# Altium integrated library Connector.IntLib: 213 symbols (part 1 of 2) (continued)
## MOLEX 43045-0200
designator J?
Micro-Fit 3.0 Right-Angle Header, 3.00mm, Dual Row, 2 Circuits
footprint MOLEX 43045-0200 (Micro-Fit 3.0 Right Angle Header, 3.00mm Pitch, Dual Row, 2 Circuits)
pins: 1, 2

## MOLEX 43045-0212
designator J?
Micro-Fit 3.0 Vertical Header, 3.00mm Pitch, Dual Row, 2 Circuits
footprint MOLEX 43045-0212 (Micro-Fit 3.0 Vertical Header, 3.00mm Pitch, Dual Row, 2 Circuits)
pins: 1, 2

## MOLEX 43045-0400
designator J?
Micro-Fit 3.0 Right-Angle Header, 3.00mm Pitch, Dual Row, 4 Circuits
footprint MOLEX 43045-0400 (Micro-Fit 3.0 Right Angle Header, 3.00mm Pitch, Dual Row, 4 Circuits)
pins: 1, 2, 3, 4

## MOLEX 43045-0412
designator J?
Micro-Fit 3.0 Vertical Header, 3.00mm Pitch, Dual Row, 4 Circuits
footprint MOLEX 43045-0412 (Micro-Fit 3.0 Vertical Header, 3.00mm Pitch, Dual Row, 4 Circuits)
pins: 1, 2, 3, 4

## MOLEX 43045-0418
designator J?
Micro-Fit 3.0 Vertical Header, 3.00mm Pitch, Dual Row, 4 Circuits
footprint MOLEX 43045-0418 (Micro-Fit 3.0 Vertical Header, 3.00mm Pitch, Dual Row, 4 Circuits)
pins: 1, 2, 3, 4

## MOLEX 43045-0600
designator J?
Micro-Fit 3.0 Right-Angle Header, 3.00mm Pitch, Dual Row, 6 Circuits
footprint MOLEX 43045-0600 (Micro-Fit 3.06 Right Angle Header, 3.00mm Pitch, Dual Row, 6 Circuits)
pins: 1, 2, 3, 4, 5, 6

## MOLEX 43045-0612
designator J?
Micro-Fit 3.0 Vertical Header, 3.00mm Pitch, Dual Row, 6 Circuits
footprint MOLEX 43045-0612 (Micro-Fit 3.0 Vertical Header, 3.00mm Pitch, Dual Row, 6 Circuits)
pins: 1, 2, 3, 4, 5, 6

## MOLEX 43045-0618
designator J?
Micro-Fit 3.0 Vertical Header, 3.00mm Pitch, Dual Row, 6 Circuits
footprint MOLEX 43045-0618 (Micro-Fit 3.0 Vertical Header, 3.00mm Pitch, Dual Row, 6 Circuits)
pins: 1, 2, 3, 4, 5, 6

## MOLEX 43045-0800
designator J?
Micro-Fit 3.0 Right-Angle Header, 3.00mm Pitch, Dual Row, 8 Circuits
footprint MOLEX 43045-0800 (Micro-Fit 3.0 Right Angle Header, 3.00mm Pitch, Dual Row, 8 Circuits)
pins: 1, 2, 3, 4, 5, 6, 7, 8

## MOLEX 43045-0812
designator J?
Micro-Fit 3.0 Vertical Header, 3.00mm Pitch, Dual Row, 8 Circuits
footprint MOLEX 43045-0812 (Micro-Fit 3.0 Vertical Header, 3.00mm Pitch, Dual Row, 8 Circuits)
pins: 1, 2, 3, 4, 5, 6, 7, 8

## MOLEX 43045-1000
designator J?
Micro-Fit 3.0 Right-Angle Header, 3.00mm Pitch, Dual Row, 10 Circuits
footprint MOLEX 43045-1000 (Micro-Fit 3.0 Right Angle Header, 3.00mm Pitch, Dual Row, 10 Circuits)
pins: 1, 2, 3, 4, 5, 6, 7, 8, 9, 10

## MOLEX 43045-1012
designator J?
Micro-Fit 3.0 Vertical Header, 3.00mm Pitch, Dual Row, 10 Circuits
footprint MOLEX 43045-1012 (Micro-Fit 3.0 Vertical Header, 3.00mm Pitch, Dual Row, 10 Circuits)
pins: 1, 2, 3, 4, 5, 6, 7, 8, 9, 10

## MOLEX 43045-1200
designator J?
Micro-Fit 3.0 Right-Angle Header, 3.00mm Pitch, Dual Row, 12 Circuits
footprint MOLEX 43045-1200 (Micro-Fit 3.0 Right Angle Header, 3.00mm Pitch, Dual Row, 12 Circuits)
pins: 1, 2, 3, 4, 5, 6, 7, 8, 9, 10, 11, 12

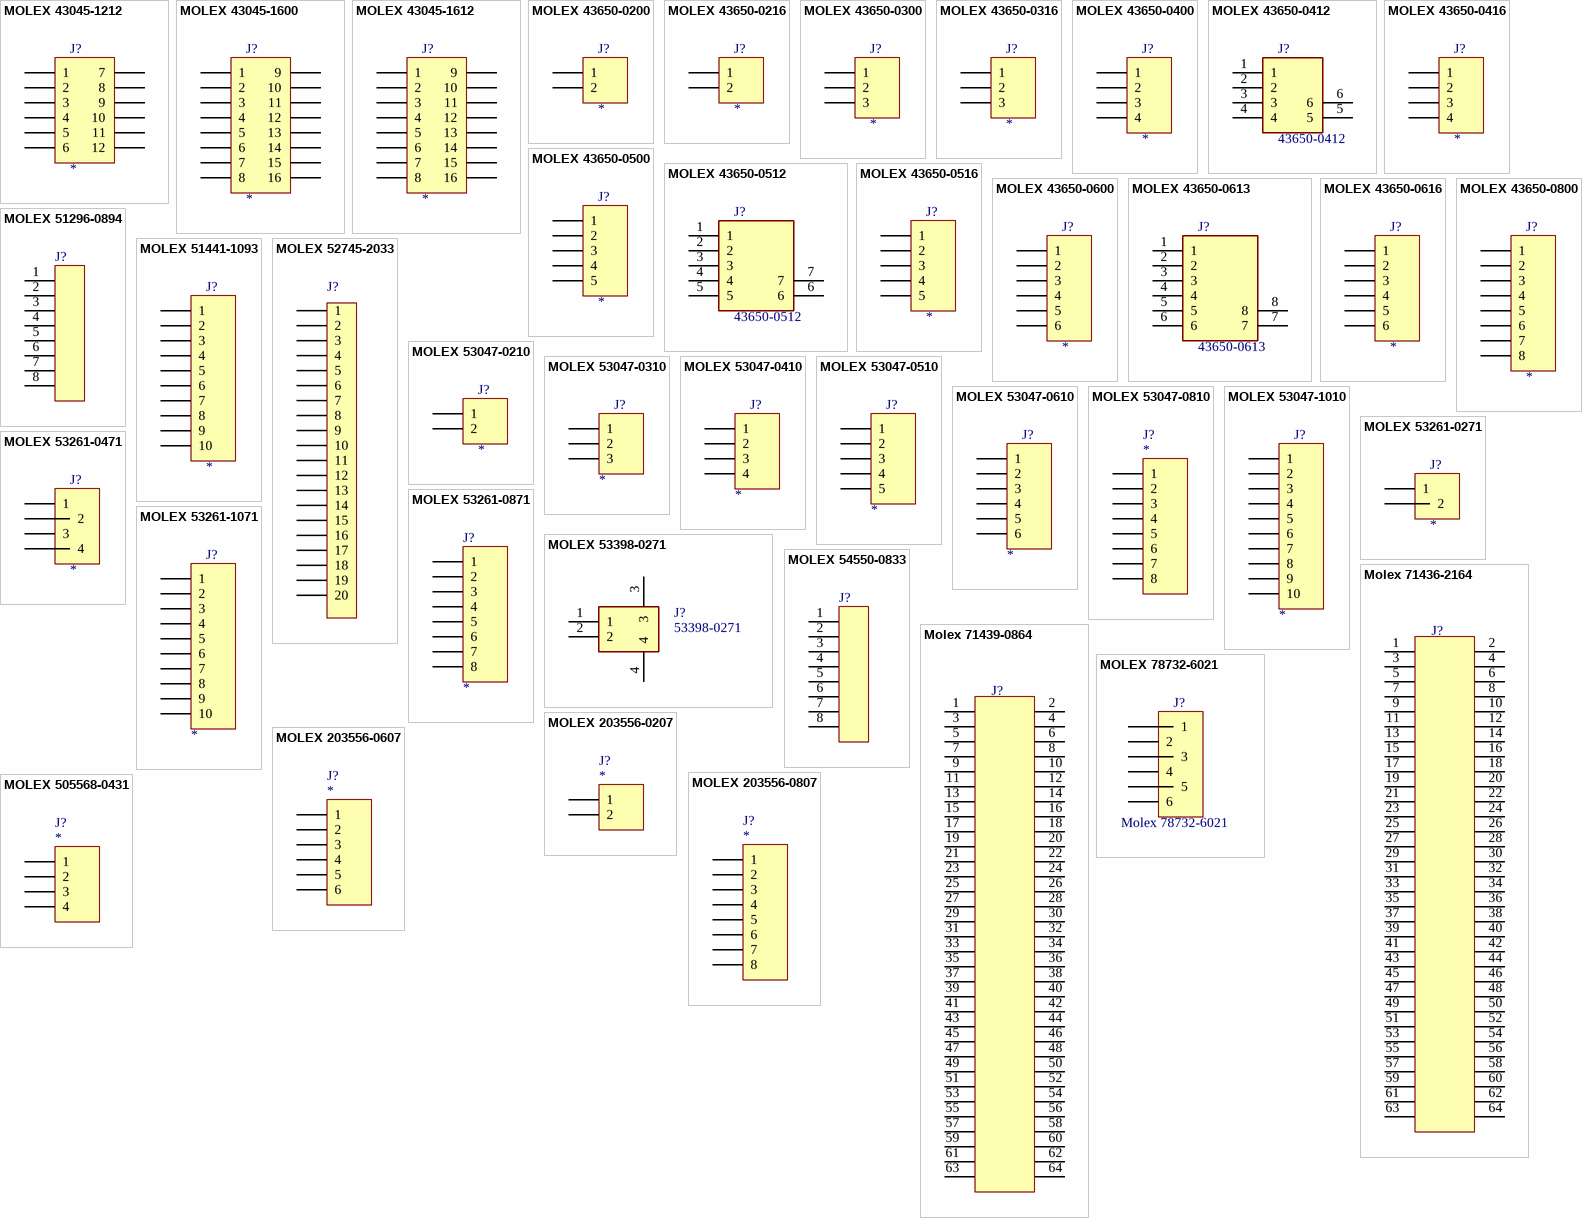
[diagram p4: symbols MOLEX 43045-1212 to MOLEX 505568-0431]

## MOLEX 43045-1212
designator J?
Micro-Fit 3.0 Vertical Header, 3.00mm Pitch, Dual Row, 12 Circuits
footprint MOLEX 43045-1212 (Micro-Fit 3.0 Vertical Header, 3.00mm Pitch, Dual Row, 12 Circuits)
pins: 1, 2, 3, 4, 5, 6, 7, 8, 9, 10, 11, 12

## MOLEX 43045-1600
designator J?
Micro-Fit 3.0 Right-Angle Header, 3.00mm Pitch, Dual Row, 16 Circuits
footprint MOLEX 43045-1600 (Micro-Fit 3.0 Right Angle Header, 3.00mm Pitch, Dual Row, 16 Circuits)
pins: 1, 2, 3, 4, 5, 6, 7, 8, 9, 10, 11, 12, 13, 14, 15, 16

## MOLEX 43045-1612
designator J?
Micro-Fit 3.0 Vertical Header, 3.00mm Pitch, Dual Row, 16 Circuits
footprint MOLEX 43045-1612 (Micro-Fit 3.0 Vertical Header, 3.00mm Pitch, Dual Row, 16 Circuits)
pins: 1, 2, 3, 4, 5, 6, 7, 8, 9, 10, 11, 12, 13, 14, 15, 16

## MOLEX 43650-0200
designator J?
Micro-Fit 3.0 Right-Angle Header, 3.00mm Pitch, Single Row, 2 Circuits
footprint MOLEX 43650-0200 (Micro-Fit 3.0 Right Angle Header, 3.00mm Pitch, Single Row, 2 Circuits)
pins: 1, 2

## MOLEX 43650-0216
designator J?
Micro-Fit 3.0 Vertical Header, 3.00mm Pitch, Single Row, 2 Circuits
footprint MOLEX 43650-0216 (Micro-Fit 3.0 Vertical Header, 3.00mm Pitch, Single Row, 2 Circuits)
pins: 1, 2

## MOLEX 43650-0300
designator J?
Micro-Fit 3.0 Right-Angle Header, 3.00mm Pitch, Single Row, 3 Circuits
footprint MOLEX 43650-0300 (Micro-Fit 3.0 Right Angle Header, 3.00mm Pitch, Single Row, 3 Circuits)
pins: 1, 2, 3

## MOLEX 43650-0316
designator J?
Micro-Fit 3.0 Vertical Header, 3.00mm Pitch, Single Row, 3 Circuits
footprint MOLEX 43650-0316 (Micro-Fit 3.0 Vertical Header, 3.00mm Pitch, Single Row, 3 Circuits)
pins: 1, 2, 3

## MOLEX 43650-0400
designator J?
Micro-Fit 3.0 Right-Angle Header, 3.00mm Pitch, Single Row, 4 Circuits
footprint MOLEX 43650-0400 (Micro-Fit 3.0 Right Angle Header, 3.00mm Pitch, Single Row, 4 Circuits)
pins: 1, 2, 3, 4

## MOLEX 43650-0412
designator J?, comment 43650-0412
MicroFit RA HDR 4Ckt SR SMT w/SldTab; Manufacturer: Molex; Mouser No: 538-43650-0412; Value: 43650-0412
footprint MOLEX 43650-0412 (MicroFit RA HDR 4Ckt SR SMT w/SldTab)
pins: 1, 2, 3, 4, 5, 6

## MOLEX 43650-0416
designator J?
Micro-Fit 3.0 Vertical Header, 3.00mm Pitch, Single Row, 4 Circuits
footprint MOLEX 43650-0416 (Micro-Fit 3.0 Vertical Header, 3.00mm Pitch, Single Row, 4 Circuits)
pins: 1, 2, 3, 4

## MOLEX 43650-0500
designator J?
Micro-Fit 3.0 Right-Angle Header, 3.00mm Pitch, Single Row, 5 Circuits
footprint MOLEX 43650-0500 (Micro-Fit 3.0 Right Angle Header, 3.00mm Pitch, Single Row, 5 Circuits)
pins: 1, 2, 3, 4, 5

## MOLEX 43650-0512
designator J?, comment 43650-0512
MicroFit RA HDR 5Ckt SR SMT w/SldTab; Manufacturer: Molex; Mouser No: 538-43650-0512; Value: 43650-0512
footprint MOLEX 43650-0512 (MicroFit RA HDR 5Ckt SR SMT w/SldTab)
pins: 1, 2, 3, 4, 5, 6, 7

## MOLEX 43650-0516
designator J?
Micro-Fit 3.0 Vertical Header, 3.00mm Pitch, Single Row, 5 Circuits
footprint MOLEX 43650-0516 (Micro-Fit 3.0 Vertical Header, 3.00mm Pitch, Single Row, 5 Circuits)
pins: 1, 2, 3, 4, 5

## MOLEX 43650-0600
designator J?
Micro-Fit 3.0 Right-Angle Header, 3.00mm Pitch, Single Row, 6 Circuits
footprint MOLEX 43650-0600 (Micro-Fit 3.0 Right Angle Header, 3.00mm Pitch, Single Row, 6 Circuits)
pins: 1, 2, 3, 4, 5, 6

## MOLEX 43650-0613
designator J?, comment 43650-0613
Micro-Fit 3.0 Right-Angle Header, 3.00mm Pitch, Single Row, 6 Circuits, with SolderTab, Gold, Glow-Wire Capable, Black; Manufacturer: Molex; Mouser No: 538-43650-0613; Value: 43650-0613
footprint MOLEX 43650-0613 (Micro-Fit 3.0 Right-Angle Header, 3.00mm Pitch, Single Row, 6 Circuits, with SolderTab, Gold, Glow-Wire Capable, Black)
pins: 1, 2, 3, 4, 5, 6, 7, 8

## MOLEX 43650-0616
designator J?
Micro-Fit 3.0 Vertical Header, 3.00mm Pitch, Single Row, 6 Circuits
footprint MOLEX 43650-0616 (Micro-Fit 3.0 Vertical Header, 3.00mm Pitch, Single Row, 6 Circuits)
pins: 1, 2, 3, 4, 5, 6

## MOLEX 43650-0800
designator J?
Micro-Fit 3.0 Right-Angle Header, 3.00mm Pitch, Single Row, 8 Circuits
footprint MOLEX 43650-0800 (Micro-Fit 3.0 Right Angle Header, 3.00mm Pitch, Single Row, 8 Circuits)
pins: 1, 2, 3, 4, 5, 6, 7, 8

## MOLEX 51296-0894
designator J?  (value not drawn)
FFC/FPC Connector 8 pins, 1.30mm Height, Right-Angle; Value: MOLEX 51296-0894
footprint MOLEX 51296-0894 (FPC Connector, 8-Leads, Right Angle, Pitch 0.5 mm, Mated Height 1.3 mm, SMT)
pins: 1, 2, 3, 4, 5, 6, 7, 8

## MOLEX 51441-1093
designator J?
0.50mm Pitch, FFC/FPC Connector, Right Angle, SMT, ZIF, Bottom / Contact Style, 10 Circuits
footprint MOLEX 51441-1093 (USB-MICRO-B HIROSE nr. ZX62D-B-5PA8)
pins: 1, 2, 3, 4, 5, 6, 7, 8, 9, 10

## MOLEX 52745-2033
designator J?, comment MOLEX 51296-0894  (value not drawn)
0.50mm Pitch,  FFC/FPC Connector, Right Angle, Surface Mount, ZIF, Top / Contact Style, 20 Circuits; Value: MOLEX 51296-0894
footprint MOLEX 52745-2033 (0.50mm Pitch Easy-On FFC/FPC Connector, Right Angle, Surface Mount, ZIF, Top Contact Style,  20 Circuits)
pins: 1, 2, 3, 4, 5, 6, 7, 8, 9, 10, 11, 12, 13, 14, 15, 16, 17, 18, 19, 20

## MOLEX 53047-0210
designator J?
1.25mm Pitch PicoBlade Vertical, 2 Circuits
footprint MOLEX 530470210 (1.25mm Pitch, PicoBlade PCB Header, Single Row, Vertical, Through Hole, 2 Circuits)
pins: 1, 2

## MOLEX 53047-0310
designator J?
1.25mm Pitch PicoBlade Vertical, 3 Circuits
footprint MOLEX 530470310 (1.25mm Pitch, PicoBlade PCB Header, Single Row, Vertical, Through Hole, 3 Circuits)
pins: 1, 2, 3

## MOLEX 53047-0410
designator J?
1.25mm Pitch PicoBlade Vertical, 4 Circuits
footprint MOLEX 530470410 (1.25mm Pitch, PicoBlade PCB Header, Single Row, Vertical, Through Hole, 4 Circuits)
pins: 1, 2, 3, 4

## MOLEX 53047-0510
designator J?
1.25mm Pitch PicoBlade Vertical, 5 Circuits
footprint MOLEX 530470510 (1.25mm Pitch, PicoBlade PCB Header, Single Row, Vertical, Through Hole, 5 Circuits)
pins: 1, 2, 3, 4, 5

## MOLEX 53047-0610
designator J?
1.25mm Pitch PicoBlade Vertical, 6 Circuits
footprint MOLEX 530470610 (1.25mm Pitch, PicoBlade PCB Header, Single Row, Vertical, Through Hole, 6 Circuits)
pins: 1, 2, 3, 4, 5, 6

## MOLEX 53047-0810
designator J?
1.25mm Pitch PicoBlade Vertical, 8 Circuits
footprint MOLEX 530470810 (1.25mm Pitch, PicoBlade PCB Header, Single Row, Vertical, Through Hole, 8 Circuits)
pins: 1, 2, 3, 4, 5, 6, 7, 8

## MOLEX 53047-1010
designator J?
1.25mm Pitch PicoBlade Vertical, 10 Circuits
footprint MOLEX 530471010 (1.25mm Pitch, PicoBlade PCB Header, Single Row, Vertical, Through Hole, 10 Circuits)
pins: 1, 2, 3, 4, 5, 6, 7, 8, 9, 10

## MOLEX 53261-0271
designator J?
1.25mm Pitch PicoBlade Header, Surface Mount, Right Angle, 2 Circuits; Value: *
footprint MOLEX 53261-0271 (1.25mm Pitch PicoBlade Header, Surface Mount, Right Angle, 2 Circuits)
pins: 1, 2

## MOLEX 53261-0471
designator J?
1.25mm Pitch PicoBlade Header, Surface Mount, Right Angle, 4 Circuits; Value: *
footprint MOLEX 53261-0471 (1.25mm Pitch PicoBlade Header, Surface Mount, Right Angle, 4 Circuits)
pins: 1, 2, 3, 4

## MOLEX 53261-0871
designator J?
1.25mm Pitch PicoBlade Header, Surface Mount, Right Angle, 8 Circuits; Value: *
footprint MOLEX 53261-0871 (1.25mm Pitch PicoBlade Header, Surface Mount, Right Angle, 8 Circuits)
pins: 1, 2, 3, 4, 5, 6, 7, 8

## MOLEX 53261-1071
designator J?
1.25mm Pitch PicoBlade Header, Surface Mount, Right Angle, 10 Circuits; Value: *
footprint MOLEX 53261-1071 (1.25mm Pitch PicoBlade Header, Surface Mount, Right Angle, 10 Circuits)
pins: 1, 2, 3, 4, 5, 6, 7, 8, 9, 10

## MOLEX 53398-0271
designator J?, comment 53398-0271
Sockel & Kabelgehäuse VERTICAL HDR SMT 2P; Manufacturer: Molex; Value: 53398-0271; Mouser No: 538-53398-0271
footprint MOLEX 53398-0271 (Sockel & Kabelgehäuse VERTICAL HDR SMT 2P)
pins: 1, 2, 3, 4

## MOLEX 54550-0833
designator J?  (value not drawn)
0.50mm Pitch Easy-On Type FFC/FPC Connector, 1.20mm Height, Right Angle, Surface Mount, ZIF, Top Contact Style, 8 Circuits; Value: MOLEX 54550-0833
footprint MOLEX 54550-0833 (0.50mm Pitch Easy-On Type FFC/FPC Connector, 1.20mm Height, Right Angle, Surface Mount, ZIF, Top Contact Style, 8 Circuits)
pins: 1, 2, 3, 4, 5, 6, 7, 8

## Molex 71436-2164
designator J?  (value not drawn)
Board-to-Board Plug, Vertical, 2-Row, Pitch 1.00mm, 64-Position; Value: *
footprint Molex 71436-2164 (Board-to-Board Plug, Vertical, 2-Row, Pitch 1.0mm, 64-Position)
pins: 1, 2, 3, 4, 5, 6, 7, 8, 9, 10, 11, 12, 13, 14, 15, 16, 17, 18, 19, 20, 21, 22, 23, 24, 25, 26, 27, 28, 29, 30, 31, 32, 33, 34, 35, 36, 37, 38, 39, 40, 41, 42, 43, 44, 45, 46, 47, 48, 49, 50, 51, 52, 53, 54, 55, 56, 57, 58, 59, 60, 61, 62, 63, 64

## Molex 71439-0864
designator J?  (value not drawn)
Board-to-Board Receptacle, Vertical, 2-Row, Pitch 1.00mm, 64-Position; Value: *
footprint Molex 71439-0864 (Board-to-Board Connector, Vertical, 2-Row, Pitch 1.0mm, 64-Position)
pins: 1, 2, 3, 4, 5, 6, 7, 8, 9, 10, 11, 12, 13, 14, 15, 16, 17, 18, 19, 20, 21, 22, 23, 24, 25, 26, 27, 28, 29, 30, 31, 32, 33, 34, 35, 36, 37, 38, 39, 40, 41, 42, 43, 44, 45, 46, 47, 48, 49, 50, 51, 52, 53, 54, 55, 56, 57, 58, 59, 60, 61, 62, 63, 64

## MOLEX 78732-6021
designator J?  value Molex 78732-6021
Compression Connector, Staggered contacts, 1.63mm Working Height, 6 Circuits
footprint MOLEX 78732-6021 (Compression Connector, Staggered contacts, 1.63mm Working Height, 6 Circuits)
pins: 1, 2, 3, 4, 5, 6

## MOLEX 203556-0207
designator J?
1.00mm Pitch, Pico-Clasp PCB Header, Single Row, Vertical, 2 Circuits
footprint MOLEX 203556-0207 (Connector 1.00mm Pitch, Molex Pico-Clasp PCB Header, Single Row, Vertical, Surface Mount, Friction Lock, 2 Circuits)
pins: 1, 2

## MOLEX 203556-0607
designator J?
1.00mm Pitch, Pico-Clasp PCB Header, Single Row, Vertical, 6 Circuits
footprint MOLEX 203556-0607 (Connector 1.00mm Pitch, Molex Pico-Clasp PCB Header, Single Row, Vertical, Surface Mount, with Inner Positive Lock, 6 Circuits)
pins: 1, 2, 3, 4, 5, 6

## MOLEX 203556-0807
designator J?
1.00mm Pitch, Pico-Clasp PCB Header, Single Row, Vertical, 8 Circuits
footprint MOLEX 203556-0807 (Connector 1.00mm Pitch, Molex Pico-Clasp PCB Header, Single Row, Vertical, Surface Mount, with Inner Positive Lock, 8 Circuits)
pins: 1, 2, 3, 4, 5, 6, 7, 8

## MOLEX 505568-0431
designator J?
1.25mm Pitch, Micro-Lock Plus PCB Header, Single Row, Vertical, Surface Mount, 4 Circuits
footprint MOLEX 505568-0431 (Connector 1.25mm Pitch, Molex Micro-Lock Plus PCB Header, Single Row, Vertical, Surface Mount,, Positive Lock, 4 Circuits,)
pins: 1, 2, 3, 4

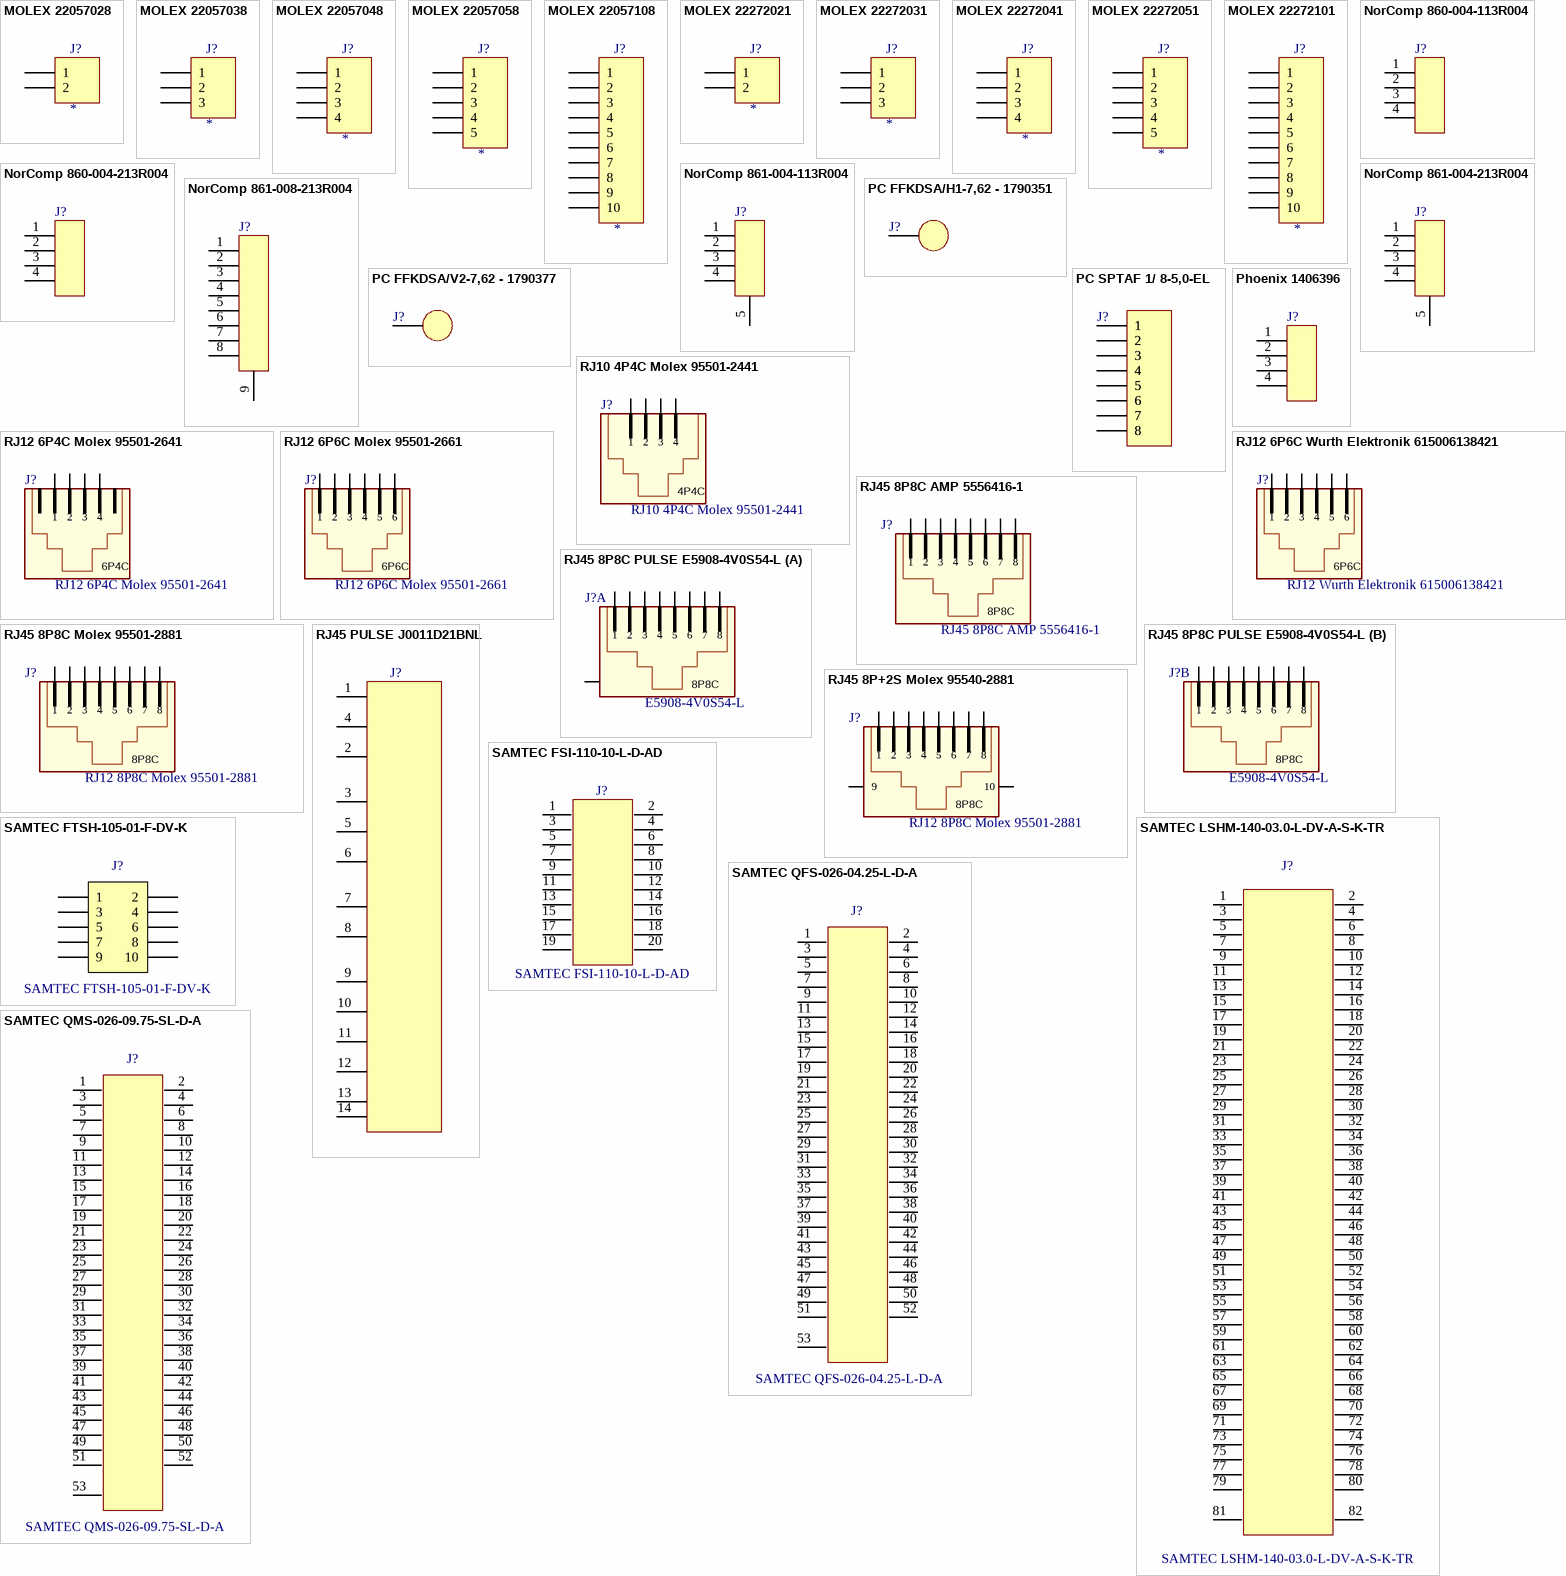
[diagram p5: symbols MOLEX 22057028 to SAMTEC QMS-026-09.75-SL-D-A]

## MOLEX 22057028
designator J?
KK 254 Wire-to-Board Header, Right-Angle, 2 Circuits
footprint MOLEX 22057028 (KK 254 Wire-to-Board Header, Right-Angle, 2 Circuits)
pins: 1, 2

## MOLEX 22057038
designator J?
KK 254 Wire-to-Board Header, Right-Angle, 3 Circuits
footprint MOLEX 22057038 (KK 254 Wire-to-Board Header, Right-Angle, 3 Circuits)
pins: 1, 2, 3

## MOLEX 22057048
designator J?
KK 254 Wire-to-Board Header, Right-Angle, 4 Circuits
footprint MOLEX 22057048 (KK 254 Wire-to-Board Header, Right-Angle, 4 Circuits)
pins: 1, 2, 3, 4

## MOLEX 22057058
designator J?
KK 254 Wire-to-Board Header, Right-Angle, 5 Circuits
footprint MOLEX 22057058 (KK 254 Wire-to-Board Header, Right-Angle, 5 Circuits)
pins: 1, 2, 3, 4, 5

## MOLEX 22057108
designator J?
KK 254 Wire-to-Board Header, Right-Angle, 10 Circuits
footprint MOLEX 22057108 (KK 254 Wire-to-Board Header, Right-Angle, 10 Circuits)
pins: 1, 2, 3, 4, 5, 6, 7, 8, 9, 10

## MOLEX 22272021
designator J?
KK 254 Wire-to-Board Header, Vertical, 2 Circuits
footprint MOLEX 22272021 (KK 254 Wire-to-Board Header, Vertical, 2 Circuits)
pins: 1, 2

## MOLEX 22272031
designator J?
KK 254 Wire-to-Board Header, Vertical, 3 Circuits
footprint MOLEX 22272031 (KK 254 Wire-to-Board Header, Vertical, 3 Circuits)
pins: 1, 2, 3

## MOLEX 22272041
designator J?
KK 254 Wire-to-Board Header, Vertical, 4 Circuits
footprint MOLEX 22272041 (KK 254 Wire-to-Board Header, Vertical, 4 Circuits)
pins: 1, 2, 3, 4

## MOLEX 22272051
designator J?
KK 254 Wire-to-Board Header, Vertical, 5 Circuits
footprint MOLEX 22272051 (KK 254 Wire-to-Board Header, Vertical, 5 Circuits)
pins: 1, 2, 3, 4, 5

## MOLEX 22272101
designator J?
KK 254 Wire-to-Board Header, Vertical, 10 Circuits
footprint MOLEX 22272101 (KK 254 Wire-to-Board Header, Vertical, 10 Circuits)
pins: 1, 2, 3, 4, 5, 6, 7, 8, 9, 10

## NorComp 860-004-113R004
designator J?  (value not drawn)
Circular Male Metric Connectors M12 4 Pos; Value: NorComp 860-004-113R004
footprint NorComp 860-004-113R004 (Connector NorComp 860-004-113R004)
pins: 1, 2, 3, 4

## NorComp 860-004-213R004
designator J?  (value not drawn)
Circular Female Metric Connectors M12 4 Pos; value: NorComp 860-004-213R004
footprint NorComp 860-004-213R004 (Connector NorComp 860-004-213R004)
pins: 1, 2, 3, 4

## NorComp 861-004-113R004
designator J?  (value not drawn)
Circular Male Metric Connectors M12 4 Pos; Value: NorComp 861-004-113R004
footprint NorComp 861-004-113R004 (Connector NorComp 861-004-113R004)
pins: 1, 2, 3, 4, 5

## NorComp 861-004-213R004
designator J?  (value not drawn)
Circular Female Metric Connectors M12 4 Pos; value: NorComp 861-004-213R004
footprint NorComp 861-004-213R004 (Connector NorComp 861-004-213R004)
pins: 1, 2, 3, 4, 5

## NorComp 861-008-213R004
designator J?  (value not drawn)
Circular Female Metric Connectors M12 8 Pos; value: NorComp 861-008-213R004
footprint NorComp 861-008-213R004
pins: 1, 2, 3, 4, 5, 6, 7, 8, 9

## PC FFKDSA/H1-7,62 - 1790351
designator J?  (value not drawn)
Phoenix Contact PCB terminal block - FFKDSA/H1-7,62 - 1790351; Value: *
footprint PC FFKDSA/H1-7,62 - 1790351 (Phoenix Contact PCB terminal block - FFKDSA/H1-7,62 - 1790351)
pins: 1 TB, 2 TB

## PC FFKDSA/V2-7,62 - 1790377
designator J?  (value not drawn)
Phoenix Contact PCB terminal block - FFKDSA/V2-7,62 - 1790377; Value: *
footprint PC FFKDSA/V2-7,62 - 1790377 (Phoenix Contact PCB terminal block - FFKDSA/H1-7,62 - 1790351)
pins: 1 TB, 2 TB

## PC SPTAF 1/ 8-5,0-EL
designator J?  (value not drawn)
Phoenix Contact PCB terminal block - SPTAF 1/ 8-5,0-EL  - 1862411; Value: *
footprint PC SPTAF 1/ 8-5,0-EL (Phoenix Contact PCB terminal block - SPTAF 1/ 8-5,0-EL  - 1862411)
pins: 1, 1' 1, 2, 2' 2, 3, 3' 3, 4, 4' 4, 5, 5' 5, 6, 6' 6, 7, 7' 7, 8, 8' 8

## Phoenix 1406396
designator J?  (value not drawn)
4 Position Circular Connector Insert, Male Pins; value: Phoenix 1406396
footprint Phoenix 1406396 (Connector Phoenix 1406396)
pins: 1, 2, 3, 4

## RJ10 4P4C Molex 95501-2441
designator J?
Modular Jack Horizontal Plastic 4P4C; Value: RJ10 4P4C Molex 95501-2441
footprint RJ10 4P4C Molex 95501-2441 (Modular Jack, Right Angle, Through Hole , 4/4,Low Profile)
pins: 1, 2, 3, 4
text: 4P4C

## RJ12 6P4C Molex 95501-2641
designator J?
Modular Jack Horizontal Plastic 6P4C; Value: RJ12 6P4C Molex 95501-2641
footprint RJ12 6P4C Molex 95501-2641 (Modular Jack, Right Angle, Through Hole , 6/4,Low Profile)
pins: 1, 2, 3, 4
text: 6P4C

## RJ12 6P6C Molex 95501-2661
designator J?
Modular Jack Horizontal Plastic 6P6C; Value: RJ12 6P6C Molex 95501-2661
footprint RJ12 6P6C Molex 95501-2661 (Modular Jack, Right Angle, Through Hole , 6/6,Low Profile)
pins: 1, 2, 3, 4, 5, 6
text: 6P6C

## RJ12 6P6C Wurth Elektronik 615006138421
designator J?, comment RJ12 Wurth Elektronik 615006138421
Modular Jack Horizontal Plastic 6P6C; Value: RJ12 Wurth Elektronik 615006138421
footprint RJ12 Wurth Elektronik 615006138421 (Footprint not found)
pins: 1, 2, 3, 4, 5, 6
text: 6P6C

## RJ45 8P8C AMP 5556416-1
designator J?
Modular Jack Vertical Plastic 8P8C; Value: RJ45 8P8C AMP 5556416-1
footprint RJ45 8P8C AMP 5556416-1 (Modular Jack, Straight, Through Hole , 8/8)
pins: 1, 2, 3, 4, 5, 6, 7, 8
text: 8P8C

## RJ45 8P8C Molex 95501-2881
designator J?, comment RJ12 8P8C Molex 95501-2881
Modular Jack Horizontal Plastic 8P8C; Value: RJ12 8P8C Molex 95501-2881
footprint RJ45 8P8C Molex 95501-2881 (Modular Jack, Right Angle, Through Hole , 8/8,Low Profile)
pins: 1, 2, 3, 4, 5, 6, 7, 8
text: 8P8C

## RJ45 8P8C PULSE E5908-4V0S54-L
designator J?, comment E5908-4V0S54-L
RJ45 2X1 8P8C Ethernet Connectors CONN 30u Au THT; Manufacturer: Pulse Electronics; Value: E5908-4V0S54-L; Mouser No.: 673-E5908-4V0S54-L
footprint RJ45 8P8C PULSE E5908-4V0S54-L (RJ45 2X1 8P8C Ethernet Connectors CONN 30u Au THT)
part A pins: 1A, 2A, 3A, 4A, 5A, 6A, 7A, 8A, 9, 10, 11, 12 SHIELD
part B pins: 1B, 2B, 3B, 4B, 5B, 6B, 7B, 8B
part A text: 1; 2; 3; 4; 5; 6; 7; 8; 8P8C
part B text: 1; 2; 3; 4; 5; 6; 7; 8; 8P8C

## RJ45 8P+2S Molex 95540-2881
designator J?, comment RJ12 8P8C Molex 95501-2881
Modular Jack Horizontal Plastic 10P10C; Value: RJ12 8P8C Molex 95501-2881
footprint RJ45 8P+2S Molex 95540-2881 (Modular Jack, Right Angle, Through Hole , 8/8,Low Profile)
pins: 1, 2, 3, 4, 5, 6, 7, 8, 9, 10
text: 8P8C

## RJ45 PULSE J0011D21BNL
designator J?, comment RJ45-PULSE-J0011D21BNL  (value not drawn)
Integrated connector modules 10/100 base-TX belMag with LEDs
footprint RJ45 PULSE J0011D21BNL (100 Base-TX (Fast Ethernet) RJ45 1x1 Tab-DOWN with LEDs 8-pin)
pins: 1 TD+, 2 TD-, 3 RD+, 4 CT, 5 CT, 6 RD-, 7 NC, 8 CHS_GND, 9 LEDL_A, 10 LEDL_K, 11 LEDR_K, 12 LEDR_A, 13 SHIELD, 14 SHIELD

## SAMTEC FSI-110-10-L-D-AD
designator J?
LOW PROFILE & ELEVATED ONE-PIECE; Value: SAMTEC FSI-110-10-L-D-AD
footprint SAMTEC FSI-110-10-L-D-AD (LOW PROFILE & ELEVATED ONE-PIECE)
pins: 1, 2, 3, 4, 5, 6, 7, 8, 9, 10, 11, 12, 13, 14, 15, 16, 17, 18, 19, 20

## SAMTEC FTSH-105-01-F-DV-K
designator J?
SAMTEC SMD MICRO HEADER 2x5; Value: SAMTEC FTSH-105-01-F-DV-K
footprint SAMTEC FTSH-105-01-F-DV-K (SAMTEC SMD MICRO HEADER 2x5)
pins: 1, 2, 3, 4, 5, 6, 7, 8, 9, 10

## SAMTEC LSHM-140-03.0-L-DV-A-S-K-TR
designator J?
0.50MM TERMINAL/SOCKET COMBO,80 PINS.; Value: *
footprint SAMTEC LSHM-140-03.0-L-DV-A-S-K-TR (0.50 mm Razor Beam™ High-Speed Hermaphroditic Terminal/Socket Strip)
pins: 1, 2, 3, 4, 5, 6, 7, 8, 9, 10, 11, 12, 13, 14, 15, 16, 17, 18, 19, 20, 21, 22, 23, 24, 25, 26, 27, 28, 29, 30, 31, 32, 33, 34, 35, 36, 37, 38, 39, 40, 41, 42, 43, 44, 45, 46, 47, 48, 49, 50, 51, 52, 53, 54, 55, 56, 57, 58, 59, 60, 61, 62, 63, 64, 65, 66, 67, 68, 69, 70, 71, 72, 73, 74, 75, 76, 77, 78, 79, 80, 81 Shield, 82 Shield

## SAMTEC QFS-026-04.25-L-D-A
designator J?
RUGGED GROUND PLANE SOCKET; Value: SAMTEC QFS-026-04.25-L-D-A
footprint SAMTEC QFS-026-04.25-L-D-A (RUGGED GROUND PLANE SOCKET)
pins: 1, 2, 3, 4, 5, 6, 7, 8, 9, 10, 11, 12, 13, 14, 15, 16, 17, 18, 19, 20, 21, 22, 23, 24, 25, 26, 27, 28, 29, 30, 31, 32, 33, 34, 35, 36, 37, 38, 39, 40, 41, 42, 43, 44, 45, 46, 47, 48, 49, 50, 51, 52, 53 Shield

## SAMTEC QMS-026-09.75-SL-D-A
designator J?
RUGGED GROUND PLANE HEADER; Value: SAMTEC QMS-026-09.75-SL-D-A
footprint SAMTEC QMS-026-09.75-SL-D-A (RUGGED GROUND PLANE HEADER)
pins: 1, 2, 3, 4, 5, 6, 7, 8, 9, 10, 11, 12, 13, 14, 15, 16, 17, 18, 19, 20, 21, 22, 23, 24, 25, 26, 27, 28, 29, 30, 31, 32, 33, 34, 35, 36, 37, 38, 39, 40, 41, 42, 43, 44, 45, 46, 47, 48, 49, 50, 51, 52, 53 Shield

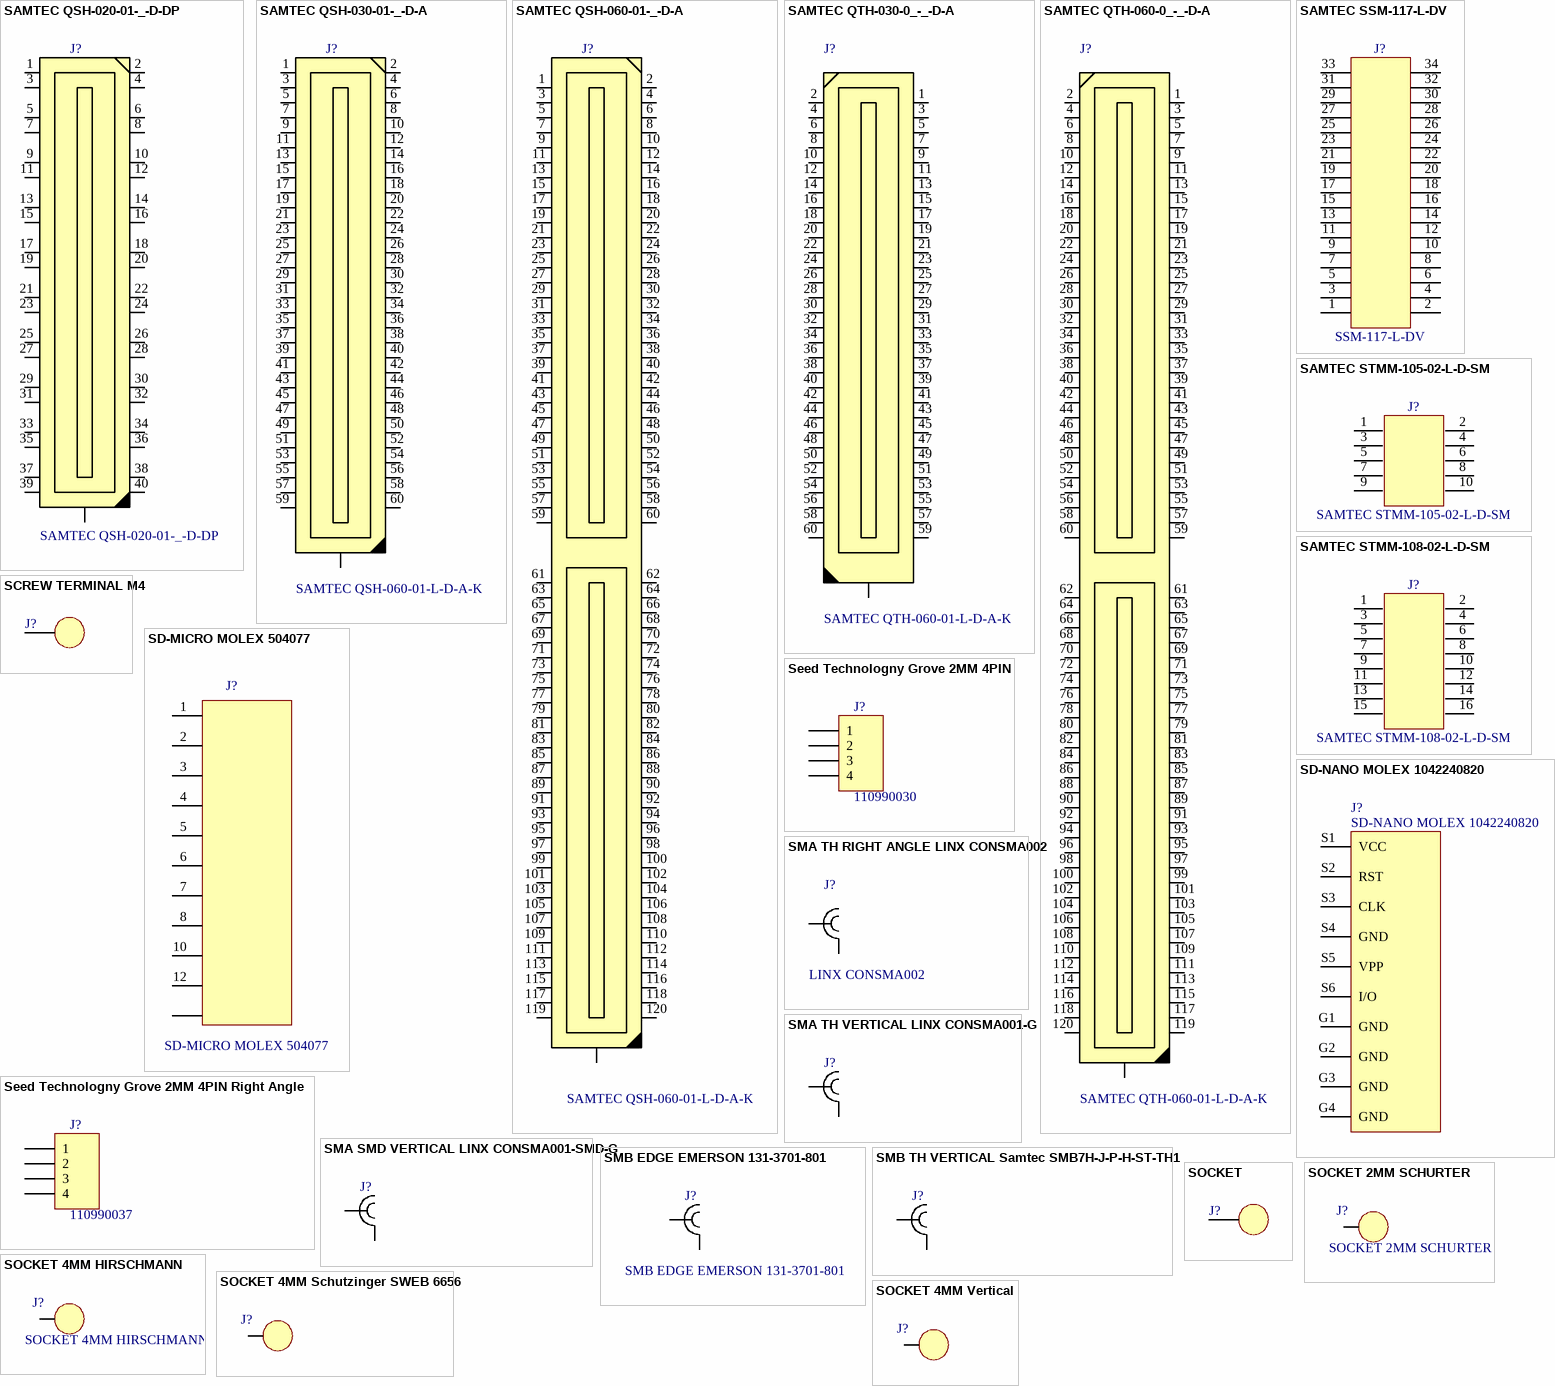
[diagram p6: symbols SAMTEC QSH-020-01-_-D-DP to SOCKET 4MM Vertical]

## SAMTEC QSH-020-01-_-D-DP
designator J?
HIGH SPEED GROUND PLANE SOCKET
footprint SAMTEC QSH-020-01-_-D-DP (High-Speed Ground Plane Socket Strip, Differential Pair)
pins: 1, 2, 3, 4, 5, 6, 7, 8, 9, 10, 11, 12, 13, 14, 15, 16, 17, 18, 19, 20, 21, 22, 23, 24, 25, 26, 27, 28, 29, 30, 31, 32, 33, 34, 35, 36, 37, 38, 39, 40, 41, 42, 43, 44

## SAMTEC QSH-030-01-_-D-A
designator J?, comment SAMTEC QSH-060-01-L-D-A-K
HIGH SPEED GROUND PLANE SOCKET
footprint SAMTEC QSH-030-01-_-D-A (HIGH SPEED GROUND PLANE SOCKET)
pins: 1, 2, 3, 4, 5, 6, 7, 8, 9, 10, 11, 12, 13, 14, 15, 16, 17, 18, 19, 20, 21, 22, 23, 24, 25, 26, 27, 28, 29, 30, 31, 32, 33, 34, 35, 36, 37, 38, 39, 40, 41, 42, 43, 44, 45, 46, 47, 48, 49, 50, 51, 52, 53, 54, 55, 56, 57, 58, 59, 60, 61, 62, 63, 64

## SAMTEC QSH-060-01-_-D-A
designator J?, comment SAMTEC QSH-060-01-L-D-A-K
HIGH SPEED GROUND PLANE SOCKET
footprint SAMTEC QSH-060-01-_-D-A (HIGH SPEED GROUND PLANE SOCKET)
pins: 1, 2, 3, 4, 5, 6, 7, 8, 9, 10, 11, 12, 13, 14, 15, 16, 17, 18, 19, 20, 21, 22, 23, 24, 25, 26, 27, 28, 29, 30, 31, 32, 33, 34, 35, 36, 37, 38, 39, 40, 41, 42, 43, 44, 45, 46, 47, 48, 49, 50, 51, 52, 53, 54, 55, 56, 57, 58, 59, 60, 61, 62, 63, 64, 65, 66, 67, 68, 69, 70, 71, 72, 73, 74, 75, 76, 77, 78, 79, 80, 81, 82, 83, 84, 85, 86, 87, 88, 89, 90, 91, 92, 93, 94, 95, 96, 97, 98, 99, 100, 101, 102, 103, 104, 105, 106, 107, 108, 109, 110, 111, 112, 113, 114, 115, 116, 117, 118, 119, 120, 121, 122, 123, 124, 125, 126, 127, 128, 129 hidden, 130 hidden

## SAMTEC QTH-030-0_-_-D-A
designator J?, comment SAMTEC QTH-060-01-L-D-A-K
HIGH SPEED GROUND PLANE HEADER
footprint SAMTEC QTH-030-03-_-D-A (HIGH SPEED GROUND PLANE HEADER)
footprint SAMTEC QTH-030-01-_-D-A (HIGH SPEED GROUND PLANE HEADER)
pins: 1, 2, 3, 4, 5, 6, 7, 8, 9, 10, 11, 12, 13, 14, 15, 16, 17, 18, 19, 20, 21, 22, 23, 24, 25, 26, 27, 28, 29, 30, 31, 32, 33, 34, 35, 36, 37, 38, 39, 40, 41, 42, 43, 44, 45, 46, 47, 48, 49, 50, 51, 52, 53, 54, 55, 56, 57, 58, 59, 60, 61, 62, 63, 64

## SAMTEC QTH-060-0_-_-D-A
designator J?, comment SAMTEC QTH-060-01-L-D-A-K
HIGH SPEED GROUND PLANE HEADER
footprint SAMTEC QTH-060-01-_-D-A (HIGH SPEED GROUND PLANE HEADER)
footprint SAMTEC QTH-060-03-_-D-A (HIGH SPEED GROUND PLANE HEADER)
pins: 1, 2, 3, 4, 5, 6, 7, 8, 9, 10, 11, 12, 13, 14, 15, 16, 17, 18, 19, 20, 21, 22, 23, 24, 25, 26, 27, 28, 29, 30, 31, 32, 33, 34, 35, 36, 37, 38, 39, 40, 41, 42, 43, 44, 45, 46, 47, 48, 49, 50, 51, 52, 53, 54, 55, 56, 57, 58, 59, 60, 61, 62, 63, 64, 65, 66, 67, 68, 69, 70, 71, 72, 73, 74, 75, 76, 77, 78, 79, 80, 81, 82, 83, 84, 85, 86, 87, 88, 89, 90, 91, 92, 93, 94, 95, 96, 97, 98, 99, 100, 101, 102, 103, 104, 105, 106, 107, 108, 109, 110, 111, 112, 113, 114, 115, 116, 117, 118, 119, 120, 121, 122, 123, 124, 125, 126, 127, 128, 129 hidden, 130 hidden

## SAMTEC SSM-117-L-DV
designator J?, comment SSM-117-L-DV
SAMTEC TIGER  CLAW™  SURFACE  MOUNT  SOCKET 2x17; Value: SSM-117-L-DV; Manufacturer: SAMTEC; Mouser No: 200-SSM117LDV
footprint SAMTEC SSM-117-L-DV (SAMTEC TIGER  CLAW™  SURFACE  MOUNT  SOCKET 2x17)
pins: 1, 2, 3, 4, 5, 6, 7, 8, 9, 10, 11, 12, 13, 14, 15, 16, 17, 18, 19, 20, 21, 22, 23, 24, 25, 26, 27, 28, 29, 30, 31, 32, 33, 34

## SAMTEC STMM-105-02-L-D-SM
designator J?
SAMTEC SHROUDED IDC HEADER 2x5; Value: SAMTEC STMM-105-02-L-D-SM
footprint SAMTEC STMM-105-02-L-D-SM (Footprint not found)
pins: 1, 2, 3, 4, 5, 6, 7, 8, 9, 10

## SAMTEC STMM-108-02-L-D-SM
designator J?
SAMTEC SHROUDED IDC HEADER 2x8; Value: SAMTEC STMM-108-02-L-D-SM
footprint SAMTEC STMM-108-02-L-D-SM (SAMTEC SHROUDED IDC HEADER 2x8)
pins: 1, 2, 3, 4, 5, 6, 7, 8, 9, 10, 11, 12, 13, 14, 15, 16

## SCREW TERMINAL M4
designator J?
KEYSTONE PC METRIC SCREW TERMINAL
footprint SCREW TERMINAL M4 (KEYSTONE METRIC SCREW TERMINAL)
pins: 1 M4, 2, 3, 4, 5, 6

## SD-MICRO MOLEX 504077
designator J?
SD Card Micro
footprint SD MICRO MOLEX 504077
pins: 1 DATA2, 2 CD/DATA3, 3 CMD, 4 VDD, 5 CLK, 6 VSS, 7 DATA0, 8 DATA1, 9 GND, 10 DLT, 11 GND, 12 DST, 13 GND, 14 GND, 15 GND, 16 GND

## SD-NANO MOLEX 1042240820
designator J?
SD Card Nano
footprint SD Nano Molex 1042240820
pins: G1 GND, G2 GND, G3 GND, G4 GND, S1 VCC, S2 RST, S3 CLK, S4 GND, S5 VPP, S6 I/O

## Seed Technologny Grove 2MM 4PIN
designator J?, comment 110990030
Seed Technologny Grove 2MM 4PIN, no 110990030; Value: 110990030
footprint Seed Technologny Grove 2MM 4PIN
pins: 1, 2, 3, 4

## Seed Technologny Grove 2MM 4PIN Right Angle
designator J?, comment 110990037
Seed Technologny Grove 2MM 4PIN, no  110990037; Value: 110990037
footprint Seed Technologny Grove 2MM 4PIN Right Angle
pins: 1, 2, 3, 4

## SMA SMD VERTICAL LINX CONSMA001-SMD-G
designator J?, comment CONSMA001-SMD-G  (value not drawn)
SMA TH VERTICAL LINX CONSMA001-SMD-G; Value: CONSMA001-SMD-G
footprint SMA SMD Vertical Linx CONSMA001-SMD-G (Connector SMA SMD Vertical Linx nr. CONSMA001-SMD-G)
pins: 1, 2

## SMA TH RIGHT ANGLE LINX CONSMA002
designator J?, comment LINX CONSMA002
SMA TH RIGHT ANGLE LINX CONSMA002; Value: LINX CONSMA002
footprint SMA TH Right Angle Linx CONSMA002 (Connector SMA TH Right Angle Linx CONSMA002)
pins: 1, 2

## SMA TH VERTICAL LINX CONSMA001-G
designator J?, comment CONSMA001-G  (value not drawn)
SMA TH VERTICAL LINX CONSMA001-G; Value: CONSMA001-G
footprint SMA TH Vertical Linx CONSMA001-G (Connector SMA Trough Hole Vertical Linx nr. CONSMA001-G)
pins: 1, 2

## SMB EDGE EMERSON 131-3701-801
designator J?
Value: EMERSON 131-3701-801
footprint SMB EDGE EMERSON 131-3701-801 (Connector SMB, Board edge mount, Emerson 131-3701-801)
pins: 1, 2

## SMB TH VERTICAL Samtec SMB7H-J-P-H-ST-TH1
designator J?  (value not drawn)
Value: Samtec SMB7H-J-P-H-ST-TH1
footprint SMB Trough Hole Vertical Samtec SMB7H-J-P-H-ST-TH1 (Footprint not found)
pins: 1, 2

## SOCKET
designator J?, comment SOCKET 2PIN  (value not drawn)
SINGLE SOCKET 2 PIN
footprint Metz Connect SR99S01VBNN00, BLACK PCB Terminal Block 90°P. (Single-pole PCB terminal block 90°P., SR99S01VBNN00, Metz Connect)
footprint Metz Connect SR99S01VBNN00, RED PCB Terminal Block 90°P. (Single-pole PCB terminal block 90°P., SR99S01VBNN00, Metz Connect)
pins: 1, 2

## SOCKET 2MM SCHURTER
designator J?
footprint SOCKET 2MM SCHURTER Black (SOCKET 2MM Schurter 0040.1101, Case 15.0x4.0, Pitch 7.6, Height 6.5, Black)
footprint SOCKET 2MM SCHURTER Red (SOCKET 2MM Schurter 0040.1102, Case 15.0x4.0, Pitch 7.6, Height 6.5, Red)
pins: 1

## SOCKET 4MM HIRSCHMANN
designator J?
footprint SOCKET 4MM HIRSCHMANN 973582101 Red (SOCKET 4MM HIRSCHMANN 973582101, Case 21x7.5, Pitch 17.5, Height 10.5, Red)
footprint SOCKET 4MM HIRSCHMANN 973582100 Black (SOCKET 4MM HIRSCHMANN 973582100, Case 21x7.5, Pitch 17.5, Height 10.5, Black)
pins: 1